# Altium footprint library Inductor.PcbLib: 24 footprints (part 2 of 2)
Each footprint in its own frame and in the unit in brackets; x right, y up, seen from the top. Pads: shape width x height; smd on the part's side, far side on the other; paste and mask are expansions set on the pad; w line width, h text height; cw(c..) or ccw(c..) is an arc to the next point about the centre after c.
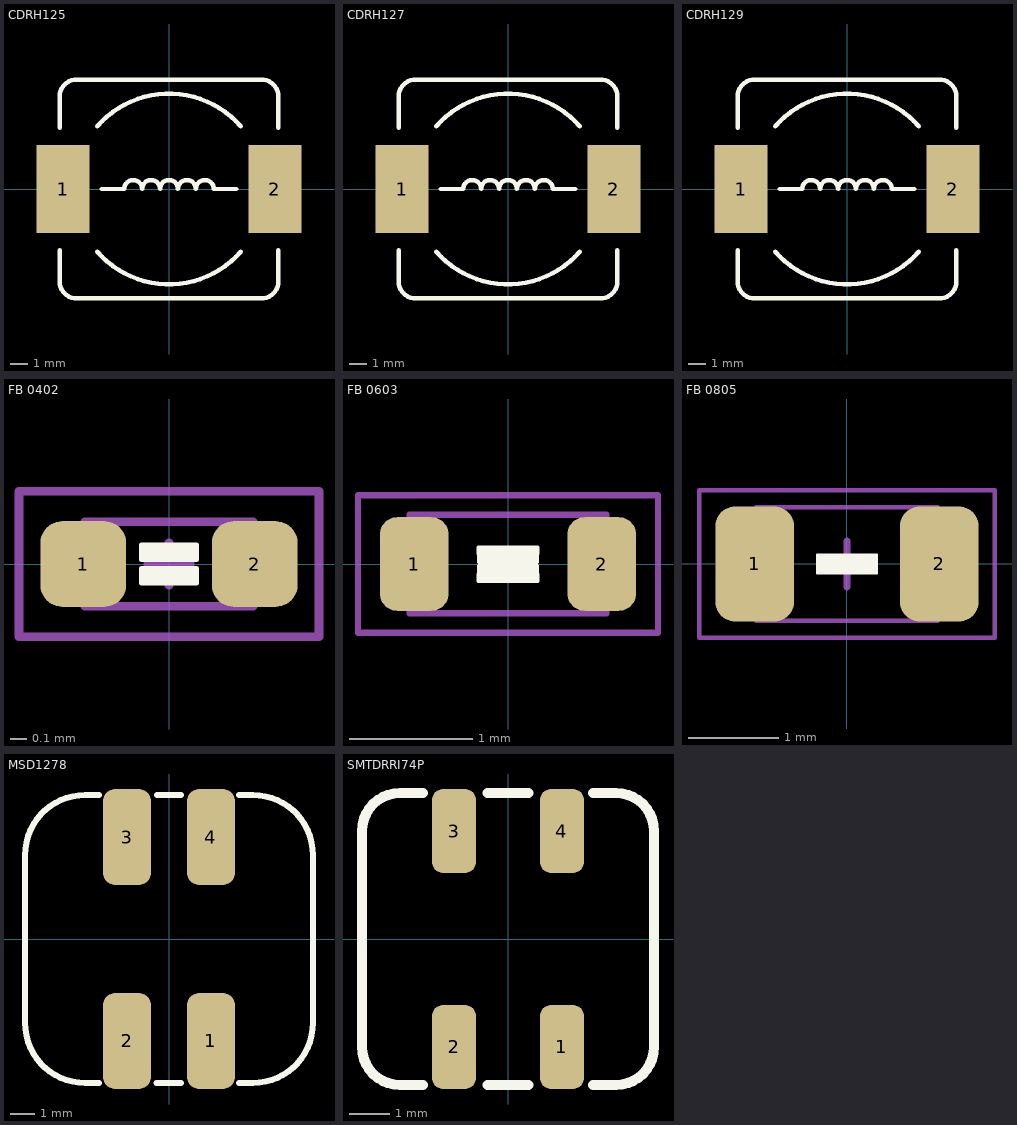
[diagram p1: the footprints below, top view; thin cyan lines are the x and y axes]

## CDRH125 [mm] "12*12*5mm（长宽高）"
pads (2):
  rect 3x5 smd: 1(-6,0) 2(6,0)
Top Overlay:
  lines w0.254: -6.2,-3.475 -6.2,-5.23 ccw(c-5.23,-5.23) -5.23,-6.2 5.23,-6.2 ccw(c5.23,-5.23) 6.2,-5.23 6.2,-3.475 ; -6.2,3.475 -6.2,5.23 cw(c-5.23,5.23) -5.23,6.2 5.23,6.2 cw(c5.23,5.23) 6.2,5.23 6.2,3.475 ; -4.064,-3.556 ccw(c0,0) 4.064,-3.556 ; -4.064,3.556 cw(c0,0) 4.064,3.556 ; -3.81,0 -2.54,0 cw(c-2.032,0) -1.524,0 cw(c-1.016,0) -0.508,0 cw(c0,0) 0.508,0 cw(c1.016,0) 1.524,0 cw(c2.032,0) 2.54,0 3.81,0
3D body "CDRH125.STEP": height 5.05, standoff 0.05, extent -6,-6 6,6

## CDRH127 [mm] "12*12*8mm（长宽高）"
pads (2):
  rect 3x5 smd: 1(-6,0) 2(6,0)
Top Overlay:
  lines w0.254: -6.2,-3.475 -6.2,-5.23 ccw(c-5.23,-5.23) -5.23,-6.2 5.23,-6.2 ccw(c5.23,-5.23) 6.2,-5.23 6.2,-3.475 ; -6.2,3.475 -6.2,5.23 cw(c-5.23,5.23) -5.23,6.2 5.23,6.2 cw(c5.23,5.23) 6.2,5.23 6.2,3.475 ; -4.064,-3.556 ccw(c0,0) 4.064,-3.556 ; -4.064,3.556 cw(c0,0) 4.064,3.556 ; -3.81,0 -2.54,0 cw(c-2.032,0) -1.524,0 cw(c-1.016,0) -0.508,0 cw(c0,0) 0.508,0 cw(c1.016,0) 1.524,0 cw(c2.032,0) 2.54,0 3.81,0
3D body "CDRH127.STEP": height 7.8, standoff 0, extent -6,-6 6,6

## CDRH129 [mm] "12*12*9.5mm（长宽高）"
pads (2):
  rect 3x5 smd: 1(-6,0) 2(6,0)
Top Overlay:
  lines w0.254: -6.2,-3.475 -6.2,-5.23 ccw(c-5.23,-5.23) -5.23,-6.2 5.23,-6.2 ccw(c5.23,-5.23) 6.2,-5.23 6.2,-3.475 ; -6.2,3.475 -6.2,5.23 cw(c-5.23,5.23) -5.23,6.2 5.23,6.2 cw(c5.23,5.23) 6.2,5.23 6.2,3.475 ; -4.064,-3.556 ccw(c0,0) 4.064,-3.556 ; -4.064,3.556 cw(c0,0) 4.064,3.556 ; -3.81,0 -2.54,0 cw(c-2.032,0) -1.524,0 cw(c-1.016,0) -0.508,0 cw(c0,0) 0.508,0 cw(c1.016,0) 1.524,0 cw(c2.032,0) 2.54,0 3.81,0
3D body "CDRH129.STEP": height 9.65, standoff 0.05, extent -6,-6 6,6

## FB 0402 [mil] "贴片磁珠"
pads (2):
  rrect50% 20x20 smd: 1(-20,0) 2(20,0)
Top Overlay:
  region: 6.5,-4.5 -6.5,-4.5 -6.5,-1 6.5,-1
  region: -6.5,4.5 6.5,4.5 6.5,1 -6.5,1
  lines w1: -6.5,-4.5 6.5,-4.5 6.5,-1 -6.5,-1 -6.5,-4.5 ; -6.5,1 -6.5,4.5 6.5,4.5 6.5,1 -6.5,1
Mechanical 13:
  lines w2: -19.69,-9.84 -19.69,9.84 19.68,9.84 19.68,-9.84 -19.69,-9.84
Mechanical 14:
  lines w2: -35,-17 35,-17 35,17 -35,17 -35,-17
Mechanical 15:
  lines w2: -5,0 5,0 ; 0,-5 0,5
3D body "742841210.x_t": height 19.29, standoff -0.39, extent -19.69,-9.84 19.68,9.85

## FB 0603 [mil] "贴片磁珠"
pads (2):
  rrect50% 22x30 smd: 1(-30,0) 2(30,0)
Top Overlay:
  region: 9.5,-5.5 -9.5,-5.5 -9.5,-0.5 9.5,-0.5
  region: -9.5,5.5 9.5,5.5 9.5,0.5 -9.5,0.5
  lines w1: -9.5,-5.5 -9.5,-0.5 9.5,-0.5 9.5,-5.5 -9.5,-5.5 ; -9.5,0.5 9.5,0.5 9.5,5.5 -9.5,5.5 -9.5,0.5
Mechanical 13:
  lines w2: -31.5,-15.75 31.5,-15.75 31.5,15.75 -31.5,15.75 -31.5,-15.75
Mechanical 14:
  lines w2: -48,-22 -48,22 48,22 48,-22 -48,-22
Mechanical 15:
  lines w2: -5,0 5,0 ; 0,-5 0,0 0,5
3D body "742792606.x_t": height 31.1, standoff -0.39, extent -31.5,-15.74 31.5,15.75

## FB 0805 [mil] "贴片磁珠"
pads (2):
  rrect50% 34x50 smd: 1(-40,0) 2(40,0)
Top Overlay:
  region: 13,-4 -13,-4 -13,1 13,1
  region: -13,4 13,4 13,-1 -13,-1
  lines w1: -13,-4 -13,1 13,1 13,-4 -13,-4 ; -13,-1 -13,4 13,4 13,-1 -13,-1
Mechanical 13:
  lines w2: -39.37,-24.61 -39.37,24.61 39.37,24.61 39.37,-24.61 -39.37,-24.61
Mechanical 14:
  lines w2: -64,-32 -64,32 64,32 64,-32 -64,-32
Mechanical 15:
  lines w3: -10,0 10,0 ; 0,-10 0,10
3D body "742792022.x_t": height 35.04, standoff -0.39, extent -39.37,-23.62 39.37,23.63

## MSD1278 [mm]
pads (4):
  rrect50% 2x4 smd: 1(1.75,-4.25) 2(-1.75,-4.25) 3(-1.75,4.25) 4(1.75,4.25)
Top Overlay:
  lines w0.254: -2.926,-6 -3.5,-6 cw(c-3.5,-3.5) -6,-3.5 -6,3.5 cw(c-3.5,3.5) -3.5,6 -2.926,6 ; -0.509,-6 0.507,-6 ; -0.508,6 0.508,6 ; 2.926,-6 3.5,-6 ccw(c3.5,-3.5) 6,-3.5 6,3.5 ccw(c3.5,3.5) 3.5,6 2.926,6
3D body "Coilcraft-MSD1278.x_t": height 8.05, standoff 0, extent -6.2,-6.1 6.1,6.2

## SMTDRRI74P [mm]
pads (4):
  rrect50% 1.1x2.1 smd: 1(1.35,-2.7) 2(-1.35,-2.7) 3(-1.35,2.7) 4(1.35,2.7)
Top Overlay:
  lines w0.254: -2.126,-3.65 -2.7,-3.65 cw(c-2.7,-2.7) -3.65,-2.7 -3.65,2.7 cw(c-2.7,2.7) -2.7,3.65 -2.126,3.65 ; -0.509,-3.65 0.507,-3.65 ; -0.508,3.65 0.508,3.65 ; 2.126,-3.65 2.7,-3.65 ccw(c2.7,-2.7) 3.65,-2.7 3.65,2.7 ccw(c2.7,2.7) 2.7,3.65 2.126,3.65
3D body "Coilcraft-MSD7342.x_t": height 4.6, standoff 0, extent -3.725,-3.725 3.725,3.725